# Altium schematic symbol library Molex FFC - FPC Connectors (SMT).SchLib: 638 symbols (part 8 of 10) (continued)
## 78127-1238
designator J?
0.5 mm Pitch Easy-On(TM) Type FPC Connector, 4.1 mm Mated Height, Vertical, Non-ZIF, SMT, 23 Circuits, -40 to 85 degC, ELV and RoHS Compliant, Tape and Reel; Manufacturer: Molex; PartNumber: 78127-1238; Circuits (Loaded): 23; Current (Max per Contact): 0.5A; Durability (mating cycles max): 20; Mated Height: 4.10mm; Material - Metal: Copper Alloy; Material - Plating Mating: Gold, Nickel; PCB Locator: No; PCB Retention: None; Pitch - Mating Interface: 0.50mm; Voltage (Max): 50V AC; PackageVersion: Rev. B, 12/2012; PackageReference: 78127-1238; PackageDescription: 23-Lead FPC Connector, Pitch 0.5 mm; Circuits (maximum): 23; Contact Position: N/A; Entry Angle: Vertical; Number of Rows: 1; Orientation: Vertical; Packing: Tape and Reel; Pitch - Termination Interface: 0.50mm; Polarized to PCB: No; RoHS: TRUE; Stackable: No; Mounting Technology: Surface Mount; ComponentLink1Description: Manufacturer URL; ComponentLink1URL: http://www.molex.com/molex/index.jsp; ComponentLink2Description: Datasheet; ComponentLink2URL: http://www.molex.com/webdocs/datasheets/pdf/en-us/0781271238_FFC_FPC_CONNECTORS.pdf; ComponentLink3Description: Package Specification; ComponentLink3URL: http://www.molex.com/pdm_docs/sd/781271238_sd.pdf
footprint MOLX-78127-1238 (FPC Connector, 23-Leads, Vertical, Pitch 0.5 mm, Mated Height 4.1 mm, SMT)
pins: 1, 2, 3, 4, 5, 6, 7, 8, 9, 10, 11, 12, 13, 14, 15, 16, 17, 18, 19, 20, 21, 22, 23

## 78127-1248
designator J?
0.5 mm Pitch Easy-On(TM) Type FPC Connector, 4.1 mm Mated Height, Vertical, Non-ZIF, SMT, 24 Circuits, -40 to 85 degC, ELV and RoHS Compliant, Tape and Reel; Manufacturer: Molex; PartNumber: 78127-1248; Circuits (Loaded): 24; Current (Max per Contact): 0.5A; Durability (mating cycles max): 20; Mated Height: 4.10mm; Material - Metal: Copper Alloy; Material - Plating Mating: Gold, Nickel; PCB Locator: No; PCB Retention: None; Pitch - Mating Interface: 0.50mm; Voltage (Max): 50V AC; PackageVersion: Rev. B, 12/2012; PackageReference: 78127-1248; PackageDescription: 24-Lead FPC Connector, Pitch 0.5 mm; Circuits (maximum): 24; Contact Position: N/A; Entry Angle: Vertical; Number of Rows: 1; Orientation: Vertical; Packing: Tape and Reel; Pitch - Termination Interface: 0.50mm; Polarized to PCB: No; RoHS: TRUE; Stackable: No; Mounting Technology: Surface Mount; ComponentLink1Description: Manufacturer URL; ComponentLink1URL: http://www.molex.com/molex/index.jsp; ComponentLink2Description: Datasheet; ComponentLink2URL: http://www.molex.com/webdocs/datasheets/pdf/en-us/0781271248_FFC_FPC_CONNECTORS.pdf; ComponentLink3Description: Package Specification; ComponentLink3URL: http://www.molex.com/pdm_docs/sd/781271248_sd.pdf
footprint MOLX-78127-1248 (FPC Connector, 24-Leads, Vertical, Pitch 0.5 mm, Mated Height 4.1 mm, SMT)
pins: 1, 2, 3, 4, 5, 6, 7, 8, 9, 10, 11, 12, 13, 14, 15, 16, 17, 18, 19, 20, 21, 22, 23, 24

## 78127-1258
designator J?
0.5 mm Pitch Easy-On(TM) Type FPC Connector, 4.1 mm Mated Height, Vertical, Non-ZIF, SMT, 25 Circuits, -40 to 85 degC, ELV and RoHS Compliant, Tape and Reel; Manufacturer: Molex; PartNumber: 78127-1258; Circuits (Loaded): 25; Current (Max per Contact): 0.5A; Durability (mating cycles max): 20; Mated Height: 4.10mm; Material - Metal: Copper Alloy; Material - Plating Mating: Gold, Nickel; PCB Locator: No; PCB Retention: None; Pitch - Mating Interface: 0.50mm; Voltage (Max): 50V AC; PackageVersion: Rev. B, 12/2012; PackageReference: 78127-1258; PackageDescription: 25-Lead FPC Connector, Pitch 0.5 mm; Circuits (maximum): 25; Contact Position: N/A; Entry Angle: Vertical; Number of Rows: 1; Orientation: Vertical; Packing: Tape and Reel; Pitch - Termination Interface: 0.50mm; Polarized to PCB: No; RoHS: TRUE; Stackable: No; Mounting Technology: Surface Mount; ComponentLink1Description: Manufacturer URL; ComponentLink1URL: http://www.molex.com/molex/index.jsp; ComponentLink2Description: Datasheet; ComponentLink2URL: http://www.molex.com/webdocs/datasheets/pdf/en-us/0781271258_FFC_FPC_CONNECTORS.pdf; ComponentLink3Description: Package Specification; ComponentLink3URL: http://www.molex.com/pdm_docs/sd/781271258_sd.pdf
footprint MOLX-78127-1258 (FPC Connector, 25-Leads, Vertical, Pitch 0.5 mm, Mated Height 4.1 mm, SMT)
pins: 1, 2, 3, 4, 5, 6, 7, 8, 9, 10, 11, 12, 13, 14, 15, 16, 17, 18, 19, 20, 21, 22, 23, 24, 25

## 78127-1268
designator J?
0.5 mm Pitch Easy-On(TM) Type FPC Connector, 4.1 mm Mated Height, Vertical, Non-ZIF, SMT, 26 Circuits, -40 to 85 degC, ELV and RoHS Compliant, Tape and Reel; Manufacturer: Molex; PartNumber: 78127-1268; Circuits (Loaded): 26; Current (Max per Contact): 0.5A; Durability (mating cycles max): 20; Mated Height: 4.10mm; Material - Metal: Copper Alloy; Material - Plating Mating: Gold, Nickel; PCB Locator: No; PCB Retention: None; Pitch - Mating Interface: 0.50mm; Voltage (Max): 50V AC; PackageVersion: Rev. B, 12/2012; PackageReference: 78127-1268; PackageDescription: 26-Lead FPC Connector, Pitch 0.5 mm; Circuits (maximum): 26; Contact Position: N/A; Entry Angle: Vertical; Number of Rows: 1; Orientation: Vertical; Packing: Tape and Reel; Pitch - Termination Interface: 0.50mm; Polarized to PCB: No; RoHS: TRUE; Stackable: No; Mounting Technology: Surface Mount; ComponentLink1Description: Manufacturer URL; ComponentLink1URL: http://www.molex.com/molex/index.jsp; ComponentLink2Description: Datasheet; ComponentLink2URL: http://www.molex.com/webdocs/datasheets/pdf/en-us/0781271268_FFC_FPC_CONNECTORS.pdf; ComponentLink3Description: Package Specification; ComponentLink3URL: http://www.molex.com/pdm_docs/sd/781271268_sd.pdf
footprint MOLX-78127-1268 (FPC Connector, 26-Leads, Vertical, Pitch 0.5 mm, Mated Height 4.1 mm, SMT)
pins: 1, 2, 3, 4, 5, 6, 7, 8, 9, 10, 11, 12, 13, 14, 15, 16, 17, 18, 19, 20, 21, 22, 23, 24, 25, 26

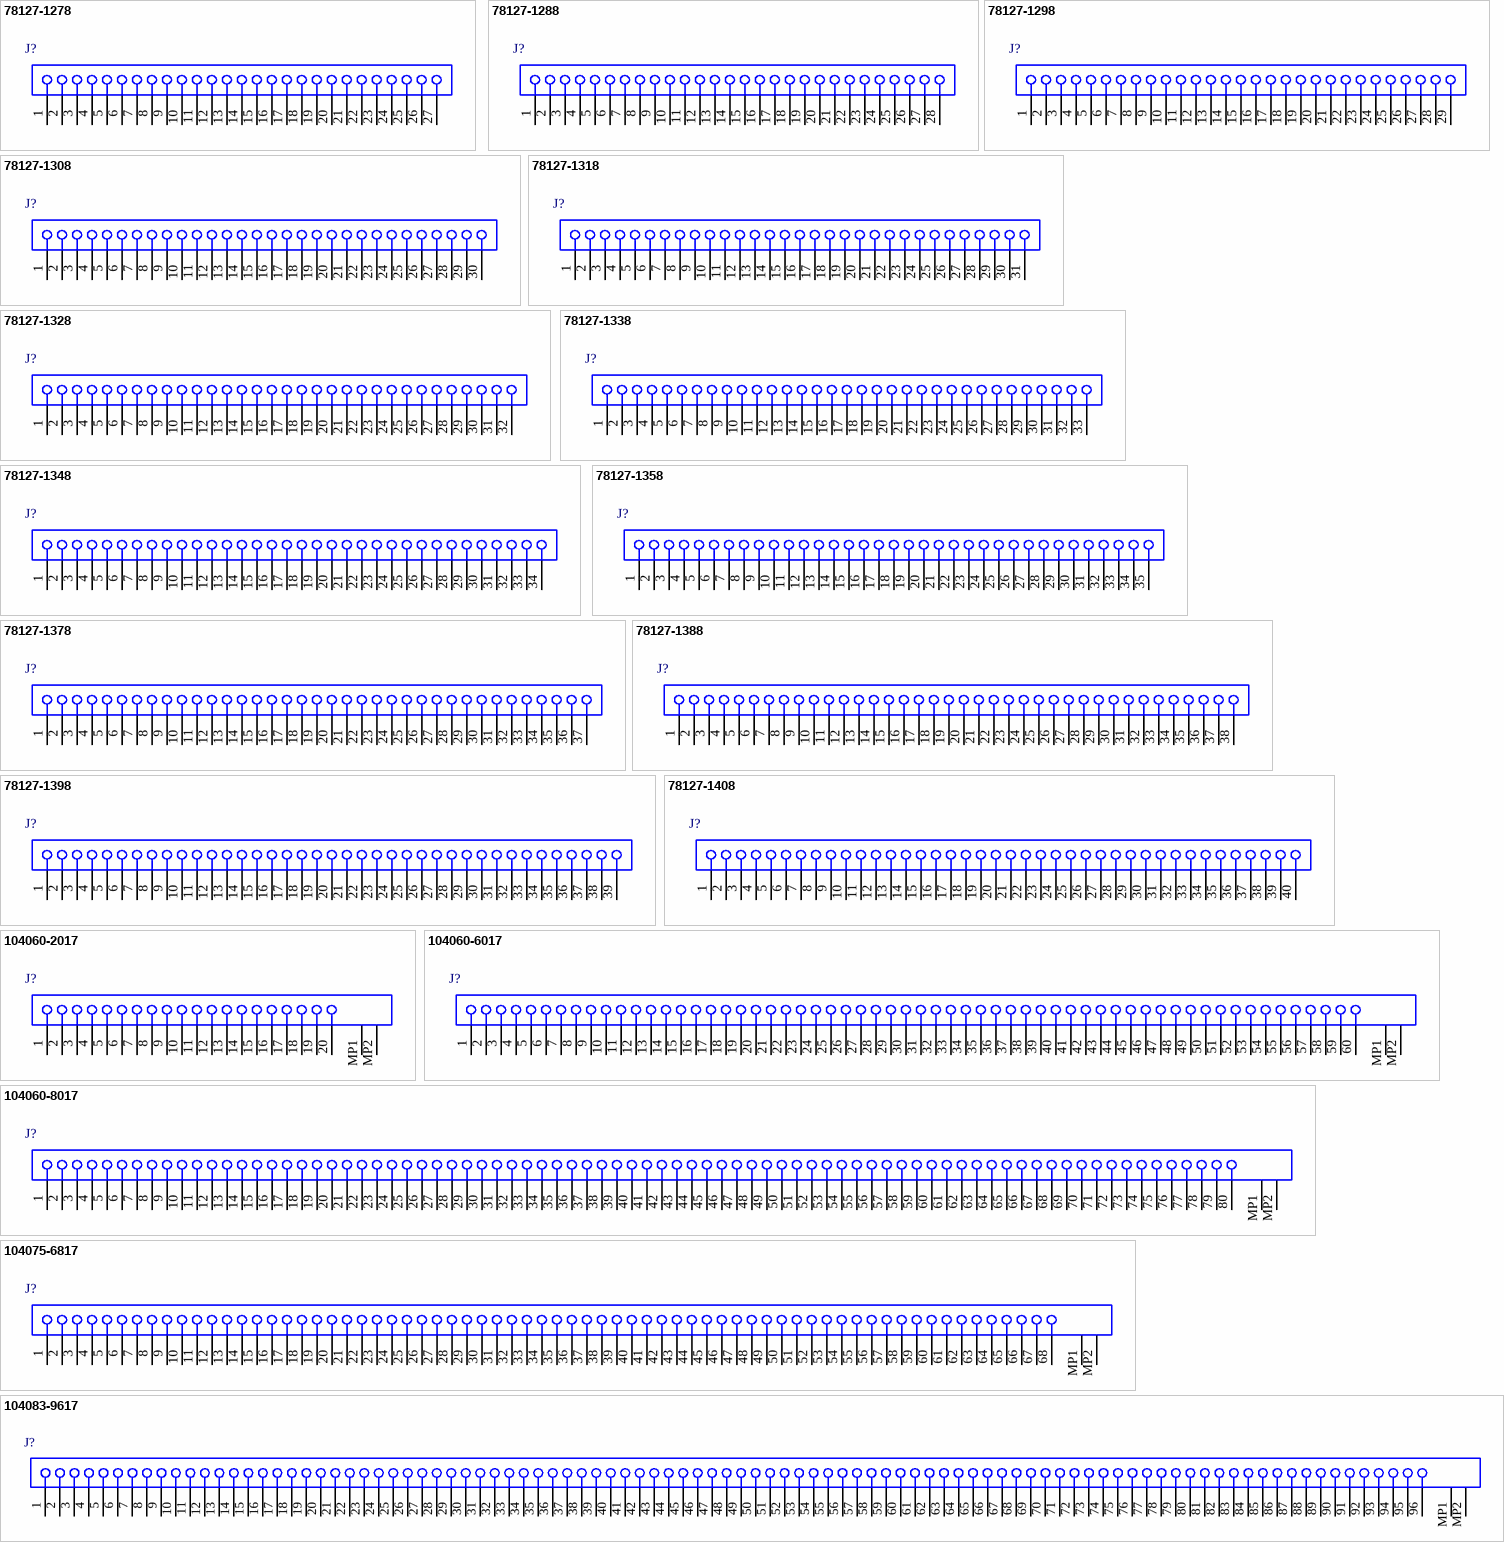
[diagram p14: symbols 78127-1278 to 104083-9617]

## 78127-1278
designator J?
0.5 mm Pitch Easy-On(TM) Type FPC Connector, 4.1 mm Mated Height, Vertical, Non-ZIF, SMT, 27 Circuits, -40 to 85 degC, ELV and RoHS Compliant, Tape and Reel; Manufacturer: Molex; PartNumber: 78127-1278; Circuits (Loaded): 27; Current (Max per Contact): 0.5A; Durability (mating cycles max): 20; Mated Height: 4.10mm; Material - Metal: Copper Alloy; Material - Plating Mating: Gold, Nickel; PCB Locator: No; PCB Retention: None; Pitch - Mating Interface: 0.50mm; Voltage (Max): 50V AC; PackageVersion: Rev. B, 12/2012; PackageReference: 78127-1278; PackageDescription: 27-Lead FPC Connector, Pitch 0.5 mm; Circuits (maximum): 27; Contact Position: N/A; Entry Angle: Vertical; Number of Rows: 1; Orientation: Vertical; Packing: Tape and Reel; Pitch - Termination Interface: 0.50mm; Polarized to PCB: No; RoHS: TRUE; Stackable: No; Mounting Technology: Surface Mount; ComponentLink1Description: Manufacturer URL; ComponentLink1URL: http://www.molex.com/molex/index.jsp; ComponentLink2Description: Datasheet; ComponentLink2URL: http://www.molex.com/webdocs/datasheets/pdf/en-us/0781271278_FFC_FPC_CONNECTORS.pdf; ComponentLink3Description: Package Specification; ComponentLink3URL: http://www.molex.com/pdm_docs/sd/781271278_sd.pdf
footprint MOLX-78127-1278 (FPC Connector, 27-Leads, Vertical, Pitch 0.5 mm, Mated Height 4.1 mm, SMT)
pins: 1, 2, 3, 4, 5, 6, 7, 8, 9, 10, 11, 12, 13, 14, 15, 16, 17, 18, 19, 20, 21, 22, 23, 24, 25, 26, 27

## 78127-1288
designator J?
0.5 mm Pitch Easy-On(TM) Type FPC Connector, 4.1 mm Mated Height, Vertical, Non-ZIF, SMT, 28 Circuits, -40 to 85 degC, ELV and RoHS Compliant, Tape and Reel; Manufacturer: Molex; PartNumber: 78127-1288; Circuits (Loaded): 28; Current (Max per Contact): 0.5A; Durability (mating cycles max): 20; Mated Height: 4.10mm; Material - Metal: Copper Alloy; Material - Plating Mating: Gold, Nickel; PCB Locator: No; PCB Retention: None; Pitch - Mating Interface: 0.50mm; Voltage (Max): 50V AC; PackageVersion: Rev. B, 12/2012; PackageReference: 78127-1288; PackageDescription: 28-Lead FPC Connector, Pitch 0.5 mm; Circuits (maximum): 28; Contact Position: N/A; Entry Angle: Vertical; Number of Rows: 1; Orientation: Vertical; Packing: Tape and Reel; Pitch - Termination Interface: 0.50mm; Polarized to PCB: No; RoHS: TRUE; Stackable: No; Mounting Technology: Surface Mount; ComponentLink1Description: Manufacturer URL; ComponentLink1URL: http://www.molex.com/molex/index.jsp; ComponentLink2Description: Datasheet; ComponentLink2URL: http://www.molex.com/webdocs/datasheets/pdf/en-us/0781271288_FFC_FPC_CONNECTORS.pdf; ComponentLink3Description: Package Specification; ComponentLink3URL: http://www.molex.com/pdm_docs/sd/781271288_sd.pdf
footprint MOLX-78127-1288 (FPC Connector, 28-Leads, Vertical, Pitch 0.5 mm, Mated Height 4.1 mm, SMT)
pins: 1, 2, 3, 4, 5, 6, 7, 8, 9, 10, 11, 12, 13, 14, 15, 16, 17, 18, 19, 20, 21, 22, 23, 24, 25, 26, 27, 28

## 78127-1298
designator J?
0.5 mm Pitch Easy-On(TM) Type FPC Connector, 4.1 mm Mated Height, Vertical, Non-ZIF, SMT, 29 Circuits, -40 to 85 degC, ELV and RoHS Compliant, Tape and Reel; Manufacturer: Molex; PartNumber: 78127-1298; Circuits (Loaded): 29; Current (Max per Contact): 0.5A; Durability (mating cycles max): 20; Mated Height: 4.10mm; Material - Metal: Copper Alloy; Material - Plating Mating: Gold, Nickel; PCB Locator: No; PCB Retention: None; Pitch - Mating Interface: 0.50mm; Voltage (Max): 50V AC; PackageVersion: Rev. B, 12/2012; PackageReference: 78127-1298; PackageDescription: 29-Lead FPC Connector, Pitch 0.5 mm; Circuits (maximum): 29; Contact Position: N/A; Entry Angle: Vertical; Number of Rows: 1; Orientation: Vertical; Packing: Tape and Reel; Pitch - Termination Interface: 0.50mm; Polarized to PCB: No; RoHS: TRUE; Stackable: No; Mounting Technology: Surface Mount; ComponentLink1Description: Manufacturer URL; ComponentLink1URL: http://www.molex.com/molex/index.jsp; ComponentLink2Description: Datasheet; ComponentLink2URL: http://www.molex.com/webdocs/datasheets/pdf/en-us/0781271298_FFC_FPC_CONNECTORS.pdf; ComponentLink3Description: Package Specification; ComponentLink3URL: http://www.molex.com/pdm_docs/sd/781271298_sd.pdf
footprint MOLX-78127-1298 (FPC Connector, 29-Leads, Vertical, Pitch 0.5 mm, Mated Height 4.1 mm, SMT)
pins: 1, 2, 3, 4, 5, 6, 7, 8, 9, 10, 11, 12, 13, 14, 15, 16, 17, 18, 19, 20, 21, 22, 23, 24, 25, 26, 27, 28, 29

## 78127-1308
designator J?
0.5 mm Pitch Easy-On(TM) Type FPC Connector, 4.1 mm Mated Height, Vertical, Non-ZIF, SMT, 30 Circuits, -40 to 85 degC, ELV and RoHS Compliant, Tape and Reel; Manufacturer: Molex; PartNumber: 78127-1308; Circuits (Loaded): 30; Current (Max per Contact): 0.5A; Durability (mating cycles max): 20; Mated Height: 4.10mm; Material - Metal: Copper Alloy; Material - Plating Mating: Gold, Nickel; PCB Locator: No; PCB Retention: None; Pitch - Mating Interface: 0.50mm; Voltage (Max): 50V AC; PackageVersion: Rev. B, 12/2012; PackageReference: 78127-1308; PackageDescription: 30-Lead FPC Connector, Pitch 0.5 mm; Circuits (maximum): 30; Contact Position: N/A; Entry Angle: Vertical; Number of Rows: 1; Orientation: Vertical; Packing: Tape and Reel; Pitch - Termination Interface: 0.50mm; Polarized to PCB: No; RoHS: TRUE; Stackable: No; Mounting Technology: Surface Mount; ComponentLink1Description: Manufacturer URL; ComponentLink1URL: http://www.molex.com/molex/index.jsp; ComponentLink2Description: Datasheet; ComponentLink2URL: http://www.molex.com/webdocs/datasheets/pdf/en-us/0781271308_FFC_FPC_CONNECTORS.pdf; ComponentLink3Description: Package Specification; ComponentLink3URL: http://www.molex.com/pdm_docs/sd/781271308_sd.pdf
footprint MOLX-78127-1308 (FPC Connector, 30-Leads, Vertical, Pitch 0.5 mm, Mated Height 4.1 mm, SMT)
pins: 1, 2, 3, 4, 5, 6, 7, 8, 9, 10, 11, 12, 13, 14, 15, 16, 17, 18, 19, 20, 21, 22, 23, 24, 25, 26, 27, 28, 29, 30

## 78127-1318
designator J?
0.5 mm Pitch Easy-On(TM) Type FPC Connector, 4.1 mm Mated Height, Vertical, Non-ZIF, SMT, 31 Circuits, -40 to 85 degC, ELV and RoHS Compliant, Tape and Reel; Manufacturer: Molex; PartNumber: 78127-1318; Circuits (Loaded): 31; Current (Max per Contact): 0.5A; Durability (mating cycles max): 20; Mated Height: 4.10mm; Material - Metal: Copper Alloy; Material - Plating Mating: Gold, Nickel; PCB Locator: No; PCB Retention: None; Pitch - Mating Interface: 0.50mm; Voltage (Max): 50V AC; PackageVersion: Rev. B, 12/2012; PackageReference: 78127-1318; PackageDescription: 31-Lead FPC Connector, Pitch 0.5 mm; Circuits (maximum): 31; Contact Position: N/A; Entry Angle: Vertical; Number of Rows: 1; Orientation: Vertical; Packing: Tape and Reel; Pitch - Termination Interface: 0.50mm; Polarized to PCB: No; RoHS: TRUE; Stackable: No; Mounting Technology: Surface Mount; ComponentLink1Description: Manufacturer URL; ComponentLink1URL: http://www.molex.com/molex/index.jsp; ComponentLink2Description: Datasheet; ComponentLink2URL: http://www.molex.com/webdocs/datasheets/pdf/en-us/0781271318_FFC_FPC_CONNECTORS.pdf; ComponentLink3Description: Package Specification; ComponentLink3URL: http://www.molex.com/pdm_docs/sd/781271318_sd.pdf
footprint MOLX-78127-1318 (FPC Connector, 31-Leads, Vertical, Pitch 0.5 mm, Mated Height 4.1 mm, SMT)
pins: 1, 2, 3, 4, 5, 6, 7, 8, 9, 10, 11, 12, 13, 14, 15, 16, 17, 18, 19, 20, 21, 22, 23, 24, 25, 26, 27, 28, 29, 30, 31

## 78127-1328
designator J?
0.5 mm Pitch Easy-On(TM) Type FPC Connector, 4.1 mm Mated Height, Vertical, Non-ZIF, SMT, 32 Circuits, -40 to 85 degC, ELV and RoHS Compliant, Tape and Reel; Manufacturer: Molex; PartNumber: 78127-1328; Circuits (Loaded): 32; Current (Max per Contact): 0.5A; Durability (mating cycles max): 20; Mated Height: 4.10mm; Material - Metal: Copper Alloy; Material - Plating Mating: Gold, Nickel; PCB Locator: No; PCB Retention: None; Pitch - Mating Interface: 0.50mm; Voltage (Max): 50V AC; PackageVersion: Rev. B, 12/2012; PackageReference: 78127-1328; PackageDescription: 32-Lead FPC Connector, Pitch 0.5 mm; Circuits (maximum): 32; Contact Position: N/A; Entry Angle: Vertical; Number of Rows: 1; Orientation: Vertical; Packing: Tape and Reel; Pitch - Termination Interface: 0.50mm; Polarized to PCB: No; RoHS: TRUE; Stackable: No; Mounting Technology: Surface Mount; ComponentLink1Description: Manufacturer URL; ComponentLink1URL: http://www.molex.com/molex/index.jsp; ComponentLink2Description: Datasheet; ComponentLink2URL: http://www.molex.com/webdocs/datasheets/pdf/en-us/0781271328_FFC_FPC_CONNECTORS.pdf; ComponentLink3Description: Package Specification; ComponentLink3URL: http://www.molex.com/pdm_docs/sd/781271328_sd.pdf
footprint MOLX-78127-1328 (FPC Connector, 32-Leads, Vertical, Pitch 0.5 mm, Mated Height 4.1 mm, SMT)
pins: 1, 2, 3, 4, 5, 6, 7, 8, 9, 10, 11, 12, 13, 14, 15, 16, 17, 18, 19, 20, 21, 22, 23, 24, 25, 26, 27, 28, 29, 30, 31, 32

## 78127-1338
designator J?
0.5 mm Pitch Easy-On(TM) Type FPC Connector, 4.1 mm Mated Height, Vertical, Non-ZIF, SMT, 33 Circuits, -40 to 85 degC, ELV and RoHS Compliant, Tape and Reel; Manufacturer: Molex; PartNumber: 78127-1338; Circuits (Loaded): 33; Current (Max per Contact): 0.5A; Durability (mating cycles max): 20; Mated Height: 4.10mm; Material - Metal: Copper Alloy; Material - Plating Mating: Gold, Nickel; PCB Locator: No; PCB Retention: None; Pitch - Mating Interface: 0.50mm; Voltage (Max): 50V AC; PackageVersion: Rev. B, 12/2012; PackageReference: 78127-1338; PackageDescription: 33-Lead FPC Connector, Pitch 0.5 mm; Circuits (maximum): 33; Contact Position: N/A; Entry Angle: Vertical; Number of Rows: 1; Orientation: Vertical; Packing: Tape and Reel; Pitch - Termination Interface: 0.50mm; Polarized to PCB: No; RoHS: TRUE; Stackable: No; Mounting Technology: Surface Mount; ComponentLink1Description: Manufacturer URL; ComponentLink1URL: http://www.molex.com/molex/index.jsp; ComponentLink2Description: Datasheet; ComponentLink2URL: http://www.molex.com/webdocs/datasheets/pdf/en-us/0781271338_FFC_FPC_CONNECTORS.pdf; ComponentLink3Description: Package Specification; ComponentLink3URL: http://www.molex.com/pdm_docs/sd/781271338_sd.pdf
footprint MOLX-78127-1338 (FPC Connector, 33-Leads, Vertical, Pitch 0.5 mm, Mated Height 4.1 mm, SMT)
pins: 1, 2, 3, 4, 5, 6, 7, 8, 9, 10, 11, 12, 13, 14, 15, 16, 17, 18, 19, 20, 21, 22, 23, 24, 25, 26, 27, 28, 29, 30, 31, 32, 33

## 78127-1348
designator J?
0.5 mm Pitch Easy-On(TM) Type FPC Connector, 4.1 mm Mated Height, Vertical, Non-ZIF, SMT, 34 Circuits, -40 to 85 degC, ELV and RoHS Compliant, Tape and Reel; Manufacturer: Molex; PartNumber: 78127-1348; Circuits (Loaded): 34; Current (Max per Contact): 0.5A; Durability (mating cycles max): 20; Mated Height: 4.10mm; Material - Metal: Copper Alloy; Material - Plating Mating: Gold, Nickel; PCB Locator: No; PCB Retention: None; Pitch - Mating Interface: 0.50mm; Voltage (Max): 50V AC; PackageVersion: Rev. B, 12/2012; PackageReference: 78127-1348; PackageDescription: 34-Lead FPC Connector, Pitch 0.5 mm; Circuits (maximum): 34; Contact Position: N/A; Entry Angle: Vertical; Number of Rows: 1; Orientation: Vertical; Packing: Tape and Reel; Pitch - Termination Interface: 0.50mm; Polarized to PCB: No; RoHS: TRUE; Stackable: No; Mounting Technology: Surface Mount; ComponentLink1Description: Manufacturer URL; ComponentLink1URL: http://www.molex.com/molex/index.jsp; ComponentLink2Description: Datasheet; ComponentLink2URL: http://www.molex.com/webdocs/datasheets/pdf/en-us/0781271348_FFC_FPC_CONNECTORS.pdf; ComponentLink3Description: Package Specification; ComponentLink3URL: http://www.molex.com/pdm_docs/sd/781271348_sd.pdf
footprint MOLX-78127-1348 (FPC Connector, 34-Leads, Vertical, Pitch 0.5 mm, Mated Height 4.1 mm, SMT)
pins: 1, 2, 3, 4, 5, 6, 7, 8, 9, 10, 11, 12, 13, 14, 15, 16, 17, 18, 19, 20, 21, 22, 23, 24, 25, 26, 27, 28, 29, 30, 31, 32, 33, 34

## 78127-1358
designator J?
0.5 mm Pitch Easy-On(TM) Type FPC Connector, 4.1 mm Mated Height, Vertical, Non-ZIF, SMT, 35 Circuits, -40 to 85 degC, ELV and RoHS Compliant, Tape and Reel; Manufacturer: Molex; PartNumber: 78127-1358; Circuits (Loaded): 35; Current (Max per Contact): 0.5A; Durability (mating cycles max): 20; Mated Height: 4.10mm; Material - Metal: Copper Alloy; Material - Plating Mating: Gold, Nickel; PCB Locator: No; PCB Retention: None; Pitch - Mating Interface: 0.50mm; Voltage (Max): 50V AC; PackageVersion: Rev. B, 12/2012; PackageReference: 78127-1358; PackageDescription: 35-Lead FPC Connector, Pitch 0.5 mm; Circuits (maximum): 35; Contact Position: N/A; Entry Angle: Vertical; Number of Rows: 1; Orientation: Vertical; Packing: Tape and Reel; Pitch - Termination Interface: 0.50mm; Polarized to PCB: No; RoHS: TRUE; Stackable: No; Mounting Technology: Surface Mount; ComponentLink1Description: Manufacturer URL; ComponentLink1URL: http://www.molex.com/molex/index.jsp; ComponentLink2Description: Datasheet; ComponentLink2URL: http://www.molex.com/webdocs/datasheets/pdf/en-us/0781271358_FFC_FPC_CONNECTORS.pdf; ComponentLink3Description: Package Specification; ComponentLink3URL: http://www.molex.com/pdm_docs/sd/781271358_sd.pdf
footprint MOLX-78127-1358 (FPC Connector, 35-Leads, Vertical, Pitch 0.5 mm, Mated Height 4.1 mm, SMT)
pins: 1, 2, 3, 4, 5, 6, 7, 8, 9, 10, 11, 12, 13, 14, 15, 16, 17, 18, 19, 20, 21, 22, 23, 24, 25, 26, 27, 28, 29, 30, 31, 32, 33, 34, 35

## 78127-1378
designator J?
0.5 mm Pitch Easy-On(TM) Type FPC Connector, 4.1 mm Mated Height, Vertical, Non-ZIF, SMT, 37 Circuits, -40 to 85 degC, ELV and RoHS Compliant, Tape and Reel; Manufacturer: Molex; PartNumber: 78127-1378; Circuits (Loaded): 37; Current (Max per Contact): 0.5A; Durability (mating cycles max): 20; Mated Height: 4.10mm; Material - Metal: Copper Alloy; Material - Plating Mating: Gold, Nickel; PCB Locator: No; PCB Retention: None; Pitch - Mating Interface: 0.50mm; Voltage (Max): 50V AC; PackageVersion: Rev. B, 12/2012; PackageReference: 78127-1378; PackageDescription: 37-Lead FPC Connector, Pitch 0.5 mm; Circuits (maximum): 37; Contact Position: N/A; Entry Angle: Vertical; Number of Rows: 1; Orientation: Vertical; Packing: Tape and Reel; Pitch - Termination Interface: 0.50mm; Polarized to PCB: No; RoHS: TRUE; Stackable: No; Mounting Technology: Surface Mount; ComponentLink1Description: Manufacturer URL; ComponentLink1URL: http://www.molex.com/molex/index.jsp; ComponentLink2Description: Datasheet; ComponentLink2URL: http://www.molex.com/webdocs/datasheets/pdf/en-us/0781271378_FFC_FPC_CONNECTORS.pdf; ComponentLink3Description: Package Specification; ComponentLink3URL: http://www.molex.com/pdm_docs/sd/781271378_sd.pdf
footprint MOLX-78127-1378 (FPC Connector, 37-Leads, Vertical, Pitch 0.5 mm, Mated Height 4.1 mm, SMT)
pins: 1, 2, 3, 4, 5, 6, 7, 8, 9, 10, 11, 12, 13, 14, 15, 16, 17, 18, 19, 20, 21, 22, 23, 24, 25, 26, 27, 28, 29, 30, 31, 32, 33, 34, 35, 36, 37

## 78127-1388
designator J?
0.5 mm Pitch Easy-On(TM) Type FPC Connector, 4.1 mm Mated Height, Vertical, Non-ZIF, SMT, 38 Circuits, -40 to 85 degC, ELV and RoHS Compliant, Tape and Reel; Manufacturer: Molex; PartNumber: 78127-1388; Circuits (Loaded): 38; Current (Max per Contact): 0.5A; Durability (mating cycles max): 20; Mated Height: 4.10mm; Material - Metal: Copper Alloy; Material - Plating Mating: Gold, Nickel; PCB Locator: No; PCB Retention: None; Pitch - Mating Interface: 0.50mm; Voltage (Max): 50V AC; PackageVersion: Rev. B, 12/2012; PackageReference: 78127-1388; PackageDescription: 38-Lead FPC Connector, Pitch 0.5 mm; Circuits (maximum): 38; Contact Position: N/A; Entry Angle: Vertical; Number of Rows: 1; Orientation: Vertical; Packing: Tape and Reel; Pitch - Termination Interface: 0.50mm; Polarized to PCB: No; RoHS: TRUE; Stackable: No; Mounting Technology: Surface Mount; ComponentLink1Description: Manufacturer URL; ComponentLink1URL: http://www.molex.com/molex/index.jsp; ComponentLink2Description: Datasheet; ComponentLink2URL: http://www.molex.com/webdocs/datasheets/pdf/en-us/0781271388_FFC_FPC_CONNECTORS.pdf; ComponentLink3Description: Package Specification; ComponentLink3URL: http://www.molex.com/pdm_docs/sd/781271388_sd.pdf
footprint MOLX-78127-1388 (FPC Connector, 38-Leads, Vertical, Pitch 0.5 mm, Mated Height 4.1 mm, SMT)
pins: 1, 2, 3, 4, 5, 6, 7, 8, 9, 10, 11, 12, 13, 14, 15, 16, 17, 18, 19, 20, 21, 22, 23, 24, 25, 26, 27, 28, 29, 30, 31, 32, 33, 34, 35, 36, 37, 38

## 78127-1398
designator J?
0.5 mm Pitch Easy-On(TM) Type FPC Connector, 4.1 mm Mated Height, Vertical, Non-ZIF, SMT, 39 Circuits, -40 to 85 degC, ELV and RoHS Compliant, Tape and Reel; Manufacturer: Molex; PartNumber: 78127-1398; Circuits (Loaded): 39; Current (Max per Contact): 0.5A; Durability (mating cycles max): 20; Mated Height: 4.10mm; Material - Metal: Copper Alloy; Material - Plating Mating: Gold, Nickel; PCB Locator: No; PCB Retention: None; Pitch - Mating Interface: 0.50mm; Voltage (Max): 50V AC; PackageVersion: Rev. B, 12/2012; PackageReference: 78127-1398; PackageDescription: 39-Lead FPC Connector, Pitch 0.5 mm; Circuits (maximum): 39; Contact Position: N/A; Entry Angle: Vertical; Number of Rows: 1; Orientation: Vertical; Packing: Tape and Reel; Pitch - Termination Interface: 0.50mm; Polarized to PCB: No; RoHS: TRUE; Stackable: No; Mounting Technology: Surface Mount; ComponentLink1Description: Manufacturer URL; ComponentLink1URL: http://www.molex.com/molex/index.jsp; ComponentLink2Description: Datasheet; ComponentLink2URL: http://www.molex.com/webdocs/datasheets/pdf/en-us/0781271398_FFC_FPC_CONNECTORS.pdf; ComponentLink3Description: Package Specification; ComponentLink3URL: http://www.molex.com/pdm_docs/sd/781271398_sd.pdf
footprint MOLX-78127-1398 (FPC Connector, 39-Leads, Vertical, Pitch 0.5 mm, Mated Height 4.1 mm, SMT)
pins: 1, 2, 3, 4, 5, 6, 7, 8, 9, 10, 11, 12, 13, 14, 15, 16, 17, 18, 19, 20, 21, 22, 23, 24, 25, 26, 27, 28, 29, 30, 31, 32, 33, 34, 35, 36, 37, 38, 39

## 78127-1408
designator J?
0.5 mm Pitch Easy-On(TM) Type FPC Connector, 4.1 mm Mated Height, Vertical, Non-ZIF, SMT, 40 Circuits, -40 to 85 degC, ELV and RoHS Compliant, Tape and Reel; Manufacturer: Molex; PartNumber: 78127-1408; Circuits (Loaded): 40; Current (Max per Contact): 0.5A; Durability (mating cycles max): 20; Mated Height: 4.10mm; Material - Metal: Copper Alloy; Material - Plating Mating: Gold, Nickel; PCB Locator: No; PCB Retention: None; Pitch - Mating Interface: 0.50mm; Voltage (Max): 50V AC; PackageVersion: Rev. B, 12/2012; PackageReference: 78127-1408; PackageDescription: 40-Lead FPC Connector, Pitch 0.5 mm; Circuits (maximum): 40; Contact Position: N/A; Entry Angle: Vertical; Number of Rows: 1; Orientation: Vertical; Packing: Tape and Reel; Pitch - Termination Interface: 0.50mm; Polarized to PCB: No; RoHS: TRUE; Stackable: No; Mounting Technology: Surface Mount; ComponentLink1Description: Manufacturer URL; ComponentLink1URL: http://www.molex.com/molex/index.jsp; ComponentLink2Description: Datasheet; ComponentLink2URL: http://www.molex.com/webdocs/datasheets/pdf/en-us/0781271408_FFC_FPC_CONNECTORS.pdf; ComponentLink3Description: Package Specification; ComponentLink3URL: http://www.molex.com/pdm_docs/sd/781271408_sd.pdf
footprint MOLX-78127-1408 (FPC Connector, 40-Leads, Vertical, Pitch 0.5 mm, Mated Height 4.1 mm, SMT)
pins: 1, 2, 3, 4, 5, 6, 7, 8, 9, 10, 11, 12, 13, 14, 15, 16, 17, 18, 19, 20, 21, 22, 23, 24, 25, 26, 27, 28, 29, 30, 31, 32, 33, 34, 35, 36, 37, 38, 39, 40
